# Altium footprint library WR-TBL_Pluggable PCB Header.PcbLib: 719 footprints (part 4 of 45)
Each footprint in its own frame and in the unit in brackets; x right, y up, seen from the top. Pads: shape width x height; smd on the part's side, far side on the other; paste and mask are expansions set on the pad; w line width, h text height; cw(c..) or ccw(c..) is an arc to the next point about the centre after c.
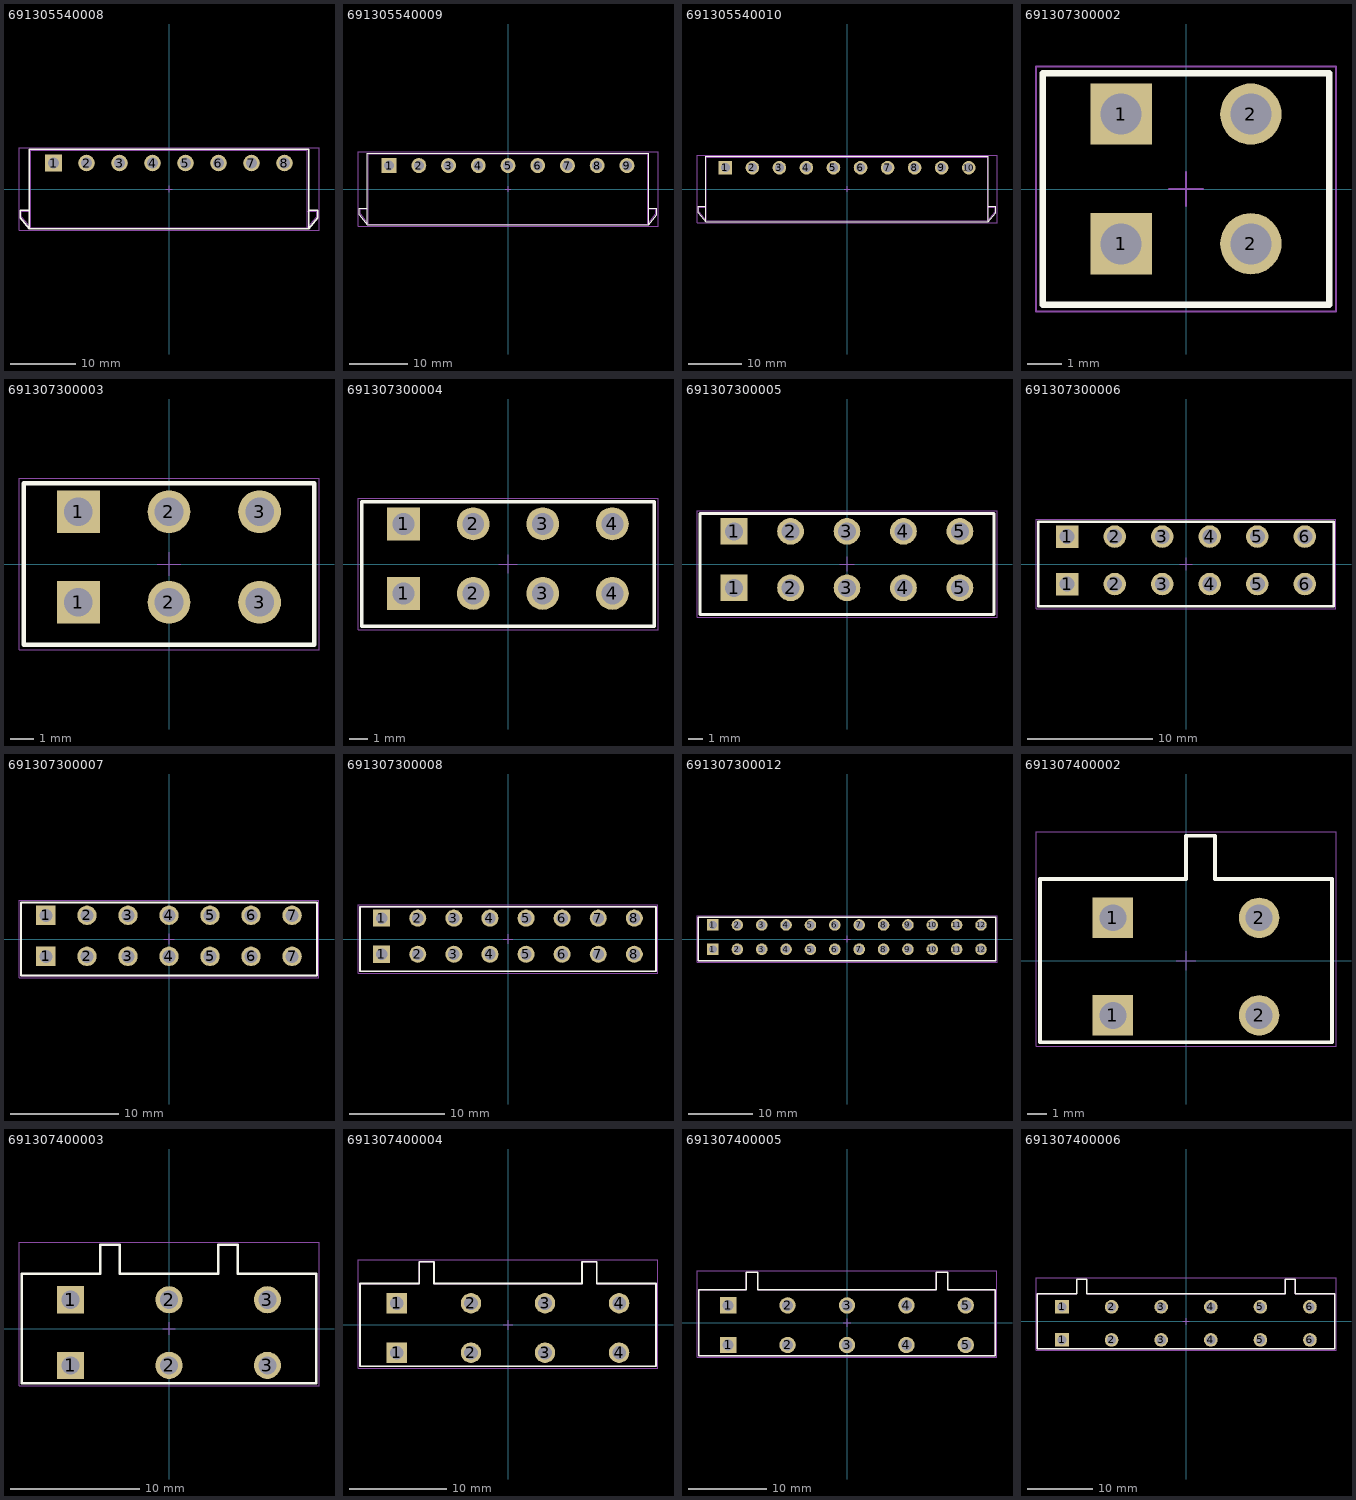
[diagram p3: the footprints below, top view; thin cyan lines are the x and y axes]

## 691305540008 [mm] "5,08mm - PCB Header Horizontal Entry with Plastic Latches - 08p"
height 8.9
pads (8):
  rect 2.55x2.55 hole 1.7: 1(-17.78,4)
  round 2.55 hole 1.7: 2(-12.7,4) 3(-7.62,4) 4(-2.54,4) 5(2.54,4) 6(7.62,4) 7(12.7,4) 8(17.78,4)
Top Overlay:
  lines w0.2: -21.495,-3.25 -22.895,-3.25 -22.895,-4.421 -21.495,-6.15 ; 21.495,-3.25 22.895,-3.25 22.895,-4.421 21.495,-6.15 ; -21.495,-6.15 -21.495,6.15 21.495,6.15 21.495,-6.15 ; -21.495,-6.15 21.495,-6.15
Mechanical 13:
  lines w0.1: -21.32,-3.411 -22.72,-3.411 -22.72,-4.271 -21.32,-6 ; 21.32,-3.411 22.72,-3.411 22.72,-4.271 21.32,-6 ; -21.32,-6 21.32,-6 ; -21.32,-6 -21.32,6 21.32,6 21.32,-6
Mechanical 15:
  lines w0.05: -0.5,0 0.5,0 ; 0,-0.5 0,0.5 ; -23.095,-6.35 -23.095,6.35 23.095,6.35 23.095,-6.35 -23.095,-6.35
3D body "691305540008.stp": height 8.63, standoff -3.97, extent -22.72,-6 22.72,6

## 691305540009 [mm] "5,08mm - PCB Header Horizontal Entry with Plastic Latches - 09p"
height 8.9
pads (9):
  rect 2.55x2.55 hole 1.7: 1(-20.32,4)
  round 2.55 hole 1.7: 2(-15.24,4) 3(-10.16,4) 4(-5.08,4) 5(0,4) 6(5.08,4) 7(10.16,4) 8(15.24,4) 9(20.32,4)
Top Overlay:
  lines w0.2: -24.035,-3.25 -25.435,-3.25 -25.435,-4.421 -24.035,-6.15 ; 24.035,-3.25 25.435,-3.25 25.435,-4.421 24.035,-6.15 ; -24.035,-6.15 24.035,-6.15 ; -24.035,-6.15 -24.035,6.15 24.035,6.15 24.035,-6.15
Mechanical 13:
  lines w0.1: -23.86,-3.411 -25.26,-3.411 -25.26,-4.271 -23.86,-6 ; 23.86,-3.411 25.26,-3.411 25.26,-4.271 23.86,-6 ; -23.86,-6 -23.86,6 23.86,6 23.86,-6 ; -23.86,-6 23.86,-6
Mechanical 15:
  lines w0.05: -0.5,0 0.5,0 ; 0,-0.5 0,0.5 ; -25.635,-6.35 25.635,-6.35 25.635,6.35 -25.635,6.35 -25.635,-6.35
3D body "691305540009.stp": height 8.63, standoff -3.97, extent -25.26,-6 25.26,6

## 691305540010 [mm] "5,08mm - PCB Header Horizontal Entry with Plastic Latches - 10p"
height 8.9
pads (10):
  rect 2.55x2.55 hole 1.7: 1(-22.86,4)
  round 2.55 hole 1.7: 2(-17.78,4) 3(-12.7,4) 4(-7.62,4) 5(-2.54,4) 6(2.54,4) 7(7.62,4) 8(12.7,4) 9(17.78,4) 10(22.86,4)
Top Overlay:
  lines w0.2: -26.575,-3.25 -27.975,-3.25 -27.975,-4.421 -26.575,-6.15 ; 26.575,-3.25 27.975,-3.25 27.975,-4.421 26.575,-6.15 ; -26.575,-6.15 26.575,-6.15 ; -26.575,-6.15 -26.575,6.15 26.575,6.15 26.575,-6.15
Mechanical 13:
  lines w0.1: -26.4,-3.411 -27.8,-3.411 -27.8,-4.271 -26.4,-6 ; 26.4,-3.411 27.8,-3.411 27.8,-4.271 26.4,-6 ; -26.4,-6 -26.4,6 26.4,6 26.4,-6 ; -26.4,-6 26.4,-6
Mechanical 15:
  lines w0.05: -0.5,0 0.5,0 ; 0,-0.5 0,0.5 ; -28.175,-6.35 28.175,-6.35 28.175,6.35 -28.175,6.35 -28.175,-6.35
3D body "691305540010.stp": height 8.63, standoff -3.97, extent -27.8,-6 27.8,6

## 691307300002 [mm] "Vertical Reserved PCB Header, pitch 3.81mm, 02p"
height 14.5
pads (4):
  rect 1.8x1.8 hole 1.2: 1(-1.905,-1.61) 1(-1.905,2.2)
  round 1.8 hole 1.2: 2(1.905,-1.61) 2(1.905,2.2)
Top Overlay:
  lines w0.2: -4.205,-3.4 4.205,-3.4 4.205,3.4 -4.205,3.4 -4.205,-3.4
Mechanical 13:
  lines w0.1: -4.205,-3.4 -4.205,3.4 4.205,3.4 4.205,-3.4 -4.205,-3.4
Mechanical 15:
  lines w0.05: -0.5,0 0.5,0 ; 0,-0.5 0,0.5 ; -4.405,-3.6 -4.405,3.6 4.405,3.6 4.405,-3.6 -4.405,-3.6
3D body "691307300002.stp": height 14.6, standoff -3.3, extent -4.205,-3.4 4.205,3.4

## 691307300003 [mm] "Vertical Reserved PCB Header, pitch 3.81mm, 03p"
height 14.5
pads (6):
  rect 1.8x1.8 hole 1.2: 1(-3.81,-1.61) 1(-3.81,2.2)
  round 1.8 hole 1.2: 2(0,-1.61) 2(0,2.2) 3(3.81,-1.61) 3(3.81,2.2)
Top Overlay:
  lines w0.2: -6.11,-3.4 6.11,-3.4 6.11,3.4 -6.11,3.4 -6.11,-3.4
Mechanical 13:
  lines w0.1: -6.11,-3.4 -6.11,3.4 6.11,3.4 6.11,-3.4 -6.11,-3.4
Mechanical 15:
  lines w0.05: -0.5,0 0.5,0 ; 0,-0.5 0,0.5 ; -6.31,-3.6 -6.31,3.6 6.31,3.6 6.31,-3.6 -6.31,-3.6
3D body "691307300003.stp": height 14.6, standoff -3.3, extent -6.11,-3.4 6.11,3.4

## 691307300004 [mm] "Vertical Reserved PCB Header, pitch 3.81mm, 04p"
height 14.5
pads (8):
  rect 1.8x1.8 hole 1.2: 1(-5.715,-1.61) 1(-5.715,2.2)
  round 1.8 hole 1.2: 2(-1.905,-1.61) 2(-1.905,2.2) 3(1.905,-1.61) 3(1.905,2.2) 4(5.715,-1.61) 4(5.715,2.2)
Top Overlay:
  lines w0.2: -8.015,-3.4 8.015,-3.4 8.015,3.4 -8.015,3.4 -8.015,-3.4
Mechanical 13:
  lines w0.1: -8.015,-3.4 -8.015,3.4 8.015,3.4 8.015,-3.4 -8.015,-3.4
Mechanical 15:
  lines w0.05: -0.5,0 0.5,0 ; 0,-0.5 0,0.5 ; -8.215,-3.6 -8.215,3.6 8.215,3.6 8.215,-3.6 -8.215,-3.6
3D body "691307300004.stp": height 14.6, standoff -3.3, extent -8.015,-3.4 8.015,3.4

## 691307300005 [mm] "Vertical Reserved PCB Header, pitch 3.81mm, 05p"
height 14.5
pads (10):
  rect 1.8x1.8 hole 1.2: 1(-7.62,-1.61) 1(-7.62,2.2)
  round 1.8 hole 1.2: 2(-3.81,-1.61) 2(-3.81,2.2) 3(0,-1.61) 3(0,2.2) 4(3.81,-1.61) 4(3.81,2.2) 5(7.62,-1.61) 5(7.62,2.2)
Top Overlay:
  lines w0.2: -9.92,-3.4 -9.92,3.4 9.92,3.4 9.92,-3.4 -9.92,-3.4
Mechanical 13:
  lines w0.1: -9.92,-3.4 9.92,-3.4 9.92,3.4 -9.92,3.4 -9.92,-3.4
Mechanical 15:
  lines w0.05: -0.5,0 0.5,0 ; 0,-0.5 0,0.5 ; -10.12,-3.6 10.12,-3.6 10.12,3.6 -10.12,3.6 -10.12,-3.6
3D body "691307300005.stp": height 14.6, standoff -3.3, extent -9.92,-3.4 9.92,3.4

## 691307300006 [mm] "Vertical Reserved PCB Header, pitch 3.81mm, 06p"
height 14.5
pads (12):
  rect 1.8x1.8 hole 1.2: 1(-9.525,-1.61) 1(-9.525,2.2)
  round 1.8 hole 1.2: 2(-5.715,-1.61) 2(-5.715,2.2) 3(-1.905,-1.61) 3(-1.905,2.2) 4(1.905,-1.61) 4(1.905,2.2) 5(5.715,-1.61) 5(5.715,2.2) 6(9.525,-1.61) 6(9.525,2.2)
Top Overlay:
  lines w0.2: -11.825,-3.4 -11.825,3.4 11.825,3.4 11.825,-3.4 -11.825,-3.4
Mechanical 13:
  lines w0.1: -11.825,-3.4 11.825,-3.4 11.825,3.4 -11.825,3.4 -11.825,-3.4
Mechanical 15:
  lines w0.05: -0.5,0 0.5,0 ; 0,-0.5 0,0.5 ; -12.025,-3.6 12.025,-3.6 12.025,3.6 -12.025,3.6 -12.025,-3.6
3D body "691307300006.stp": height 14.6, standoff -3.3, extent -11.825,-3.4 11.825,3.4

## 691307300007 [mm] "Vertical Reserved PCB Header, pitch 3.81mm, 07p"
height 14.5
pads (14):
  rect 1.8x1.8 hole 1.2: 1(-11.43,-1.61) 1(-11.43,2.2)
  round 1.8 hole 1.2: 2(-7.62,-1.61) 2(-7.62,2.2) 3(-3.81,-1.61) 3(-3.81,2.2) 4(0,-1.61) 4(0,2.2) 5(3.81,-1.61) 5(3.81,2.2) 6(7.62,-1.61) 6(7.62,2.2) 7(11.43,-1.61) 7(11.43,2.2)
Top Overlay:
  lines w0.2: -13.73,-3.4 13.73,-3.4 13.73,3.4 -13.73,3.4 -13.73,-3.4
Mechanical 13:
  lines w0.1: -13.73,-3.4 -13.73,3.4 13.73,3.4 13.73,-3.4 -13.73,-3.4
Mechanical 15:
  lines w0.05: -0.5,0 0.5,0 ; 0,-0.5 0,0.5 ; -13.93,-3.6 -13.93,3.6 13.93,3.6 13.93,-3.6 -13.93,-3.6
3D body "691307300007.stp": height 14.6, standoff -3.3, extent -13.73,-3.4 13.73,3.4

## 691307300008 [mm] "Vertical Reserved PCB Header, pitch 3.81mm, 08p"
height 14.5
pads (16):
  rect 1.8x1.8 hole 1.2: 1(-13.335,-1.61) 1(-13.335,2.2)
  round 1.8 hole 1.2: 2(-9.525,-1.61) 2(-9.525,2.2) 3(-5.715,-1.61) 3(-5.715,2.2) 4(-1.905,-1.61) 4(-1.905,2.2) 5(1.905,-1.61) 5(1.905,2.2) 6(5.715,-1.61) 6(5.715,2.2) 7(9.525,-1.61) 7(9.525,2.2) 8(13.335,-1.61) 8(13.335,2.2)
Top Overlay:
  lines w0.2: -15.635,-3.4 15.635,-3.4 15.635,3.4 -15.635,3.4 -15.635,-3.4
Mechanical 13:
  lines w0.1: -15.635,-3.4 -15.635,3.4 15.635,3.4 15.635,-3.4 -15.635,-3.4
Mechanical 15:
  lines w0.05: -0.5,0 0.5,0 ; 0,-0.5 0,0.5 ; -15.835,-3.6 -15.835,3.6 15.835,3.6 15.835,-3.6 -15.835,-3.6
3D body "691307300008.stp": height 14.6, standoff -3.3, extent -15.635,-3.4 15.635,3.4

## 691307300012 [mm] "Vertical Reserved PCB Header, pitch 3.81mm, 12p"
height 14.5
pads (24):
  rect 1.8x1.8 hole 1.2: 1(-20.955,-1.61) 1(-20.955,2.2)
  round 1.8 hole 1.2: 2(-17.145,-1.61) 2(-17.145,2.2) 3(-13.335,-1.61) 3(-13.335,2.2) 4(-9.525,-1.61) 4(-9.525,2.2) 5(-5.715,-1.61) 5(-5.715,2.2) 6(-1.905,-1.61) 6(-1.905,2.2) 7(1.905,-1.61) 7(1.905,2.2) 8(5.715,-1.61) 8(5.715,2.2) 9(9.525,-1.61) 9(9.525,2.2) 10(13.335,-1.61) 10(13.335,2.2) 11(17.145,-1.61) 11(17.145,2.2) 12(20.955,-1.61) 12(20.955,2.2)
Top Overlay:
  lines w0.2: -23.255,-3.4 23.255,-3.4 23.255,3.4 -23.255,3.4 -23.255,-3.4
Mechanical 13:
  lines w0.1: -23.255,-3.4 -23.255,3.4 23.255,3.4 23.255,-3.4 -23.255,-3.4
Mechanical 15:
  lines w0.05: -0.5,0 0.5,0 ; 0,-0.5 0,0.5 ; -23.455,-3.6 -23.455,3.6 23.455,3.6 23.455,-3.6 -23.455,-3.6
3D body "691307300012.stp": height 14.6, standoff -3.3, extent -23.255,-3.4 23.255,3.4

## 691307400002 [mm] "7.62 mm - Reversed Gender Vertical PCB Header - 02p"
height 19
pads (4):
  rect 2.1x2.1 hole 1.4: 1(-3.81,-2.85) 1(-3.81,2.23)
  round 2.1 hole 1.4: 2(3.81,-2.85) 2(3.81,2.23)
Top Overlay:
  lines w0.2: -7.61,-4.25 7.61,-4.25 7.61,4.25 1.51,4.25 1.51,6.5 0,6.5 0,4.25 -7.61,4.25 -7.61,-4.25
Mechanical 13:
  lines w0.1: -7.61,-4.25 -7.61,4.25 0,4.25 0,6.5 1.51,6.5 1.51,4.25 7.61,4.25 7.61,-4.25 -7.61,-4.25
Mechanical 15:
  lines w0.05: -0.5,0 0.5,0 ; 0,-0.5 0,0.5 ; -7.81,-4.45 -7.81,6.7 7.81,6.7 7.81,-4.45 -7.81,-4.45
3D body "691307400002.stp": height 19.05, standoff -3.45, extent -7.61,-4.25 7.61,6.5

## 691307400003 [mm] "7.62 mm - Reversed Gender Vertical PCB Header - 03p"
height 19
pads (6):
  rect 2.1x2.1 hole 1.4: 1(-7.62,-2.85) 1(-7.62,2.23)
  round 2.1 hole 1.4: 2(0,-2.85) 2(0,2.23) 3(7.62,-2.85) 3(7.62,2.23)
Top Overlay:
  lines w0.2: 3.81,4.25 -3.81,4.25 -3.81,6.5 -5.32,6.5 -5.32,4.25 -11.42,4.25 -11.42,-4.25 11.42,-4.25 11.42,4.25 5.32,4.25 5.32,6.5 3.81,6.5 3.81,4.26
Mechanical 13:
  lines w0.1: 3.81,4.25 -3.81,4.25 -3.81,6.5 -5.32,6.5 -5.32,4.25 -11.42,4.25 -11.42,-4.25 11.42,-4.25 11.42,4.25 5.32,4.25 5.32,6.5 3.81,6.5 3.81,4.26
Mechanical 15:
  lines w0.05: -0.5,0 0.5,0 ; 0,-0.5 0,0.5 ; -11.62,-4.45 11.62,-4.45 11.62,6.7 -11.62,6.7 -11.62,-4.45
3D body "691307400003.stp": height 19.05, standoff -3.45, extent -11.42,-4.25 11.42,6.5

## 691307400004 [mm] "7.62 mm - Reversed Gender Vertical PCB Header - 04p"
height 19
pads (8):
  rect 2.1x2.1 hole 1.4: 1(-11.43,-2.85) 1(-11.43,2.23)
  round 2.1 hole 1.4: 2(-3.81,-2.85) 2(-3.81,2.23) 3(3.81,-2.85) 3(3.81,2.23) 4(11.43,-2.85) 4(11.43,2.23)
Top Overlay:
  lines w0.2: 7.62,4.25 -7.62,4.25 -7.62,6.5 -9.13,6.5 -9.13,4.25 -15.23,4.25 -15.23,-4.25 15.23,-4.25 15.23,4.25 9.13,4.25 9.13,6.5 7.62,6.5 7.62,4.26
Mechanical 13:
  lines w0.1: 7.62,4.25 -7.62,4.25 -7.62,6.5 -9.13,6.5 -9.13,4.25 -15.23,4.25 -15.23,-4.25 15.23,-4.25 15.23,4.25 9.13,4.25 9.13,6.5 7.62,6.5 7.62,4.26
Mechanical 15:
  lines w0.05: -0.5,0 0.5,0 ; 0,-0.5 0,0.5 ; -15.43,-4.45 15.43,-4.45 15.43,6.7 -15.43,6.7 -15.43,-4.45
3D body "691307400004.stp": height 19.05, standoff -3.45, extent -15.23,-4.25 15.23,6.5

## 691307400005 [mm] "7.62 mm - Reversed Gender Vertical PCB Header - 05p"
height 19
pads (10):
  rect 2.1x2.1 hole 1.4: 1(-15.24,-2.85) 1(-15.24,2.23)
  round 2.1 hole 1.4: 2(-7.62,-2.85) 2(-7.62,2.23) 3(0,-2.85) 3(0,2.23) 4(7.62,-2.85) 4(7.62,2.23) 5(15.24,-2.85) 5(15.24,2.23)
Top Overlay:
  lines w0.2: 11.43,4.25 -11.43,4.25 -11.43,6.5 -12.94,6.5 -12.94,4.25 -19.04,4.25 -19.04,-4.25 19.04,-4.25 19.04,4.25 12.94,4.25 12.94,6.5 11.43,6.5 11.43,4.26
Mechanical 13:
  lines w0.1: 11.43,4.25 -11.43,4.25 -11.43,6.5 -12.94,6.5 -12.94,4.25 -19.04,4.25 -19.04,-4.25 19.04,-4.25 19.04,4.25 12.94,4.25 12.94,6.5 11.43,6.5 11.43,4.26
Mechanical 15:
  lines w0.05: -0.5,0 0.5,0 ; 0,-0.5 0,0.5 ; -19.24,-4.45 19.24,-4.45 19.24,6.7 -19.24,6.7 -19.24,-4.45
3D body "691307400005.stp": height 19.05, standoff -3.45, extent -19.04,-4.25 19.04,6.5

## 691307400006 [mm] "7.62 mm - Reversed Gender Vertical PCB Header - 06p"
height 19
pads (12):
  rect 2.1x2.1 hole 1.4: 1(-19.05,-2.85) 1(-19.05,2.23)
  round 2.1 hole 1.4: 2(-11.43,-2.85) 2(-11.43,2.23) 3(-3.81,-2.85) 3(-3.81,2.23) 4(3.81,-2.85) 4(3.81,2.23) 5(11.43,-2.85) 5(11.43,2.23) 6(19.05,-2.85) 6(19.05,2.23)
Top Overlay:
  lines w0.2: 15.24,4.25 -15.24,4.25 -15.24,6.5 -16.75,6.5 -16.75,4.25 -22.85,4.25 -22.85,-4.25 22.85,-4.25 22.85,4.25 16.75,4.25 16.75,6.5 15.24,6.5 15.24,4.26
Mechanical 13:
  lines w0.1: 15.24,4.25 -15.24,4.25 -15.24,6.5 -16.75,6.5 -16.75,4.25 -22.85,4.25 -22.85,-4.25 22.85,-4.25 22.85,4.25 16.75,4.25 16.75,6.5 15.24,6.5 15.24,4.26
Mechanical 15:
  lines w0.05: -0.5,0 0.5,0 ; 0,-0.5 0,0.5 ; -23.05,-4.45 -23.05,6.7 23.05,6.7 23.05,-4.45 -23.05,-4.45
3D body "691307400006.stp": height 19.05, standoff -3.45, extent -22.85,-4.25 22.85,6.5